# Altium schematic symbol library AA_Symbols.SchLib: 1017 symbols (part 1 of 7)
Pins are listed as number, name and electrical type; pins without a type are passive.

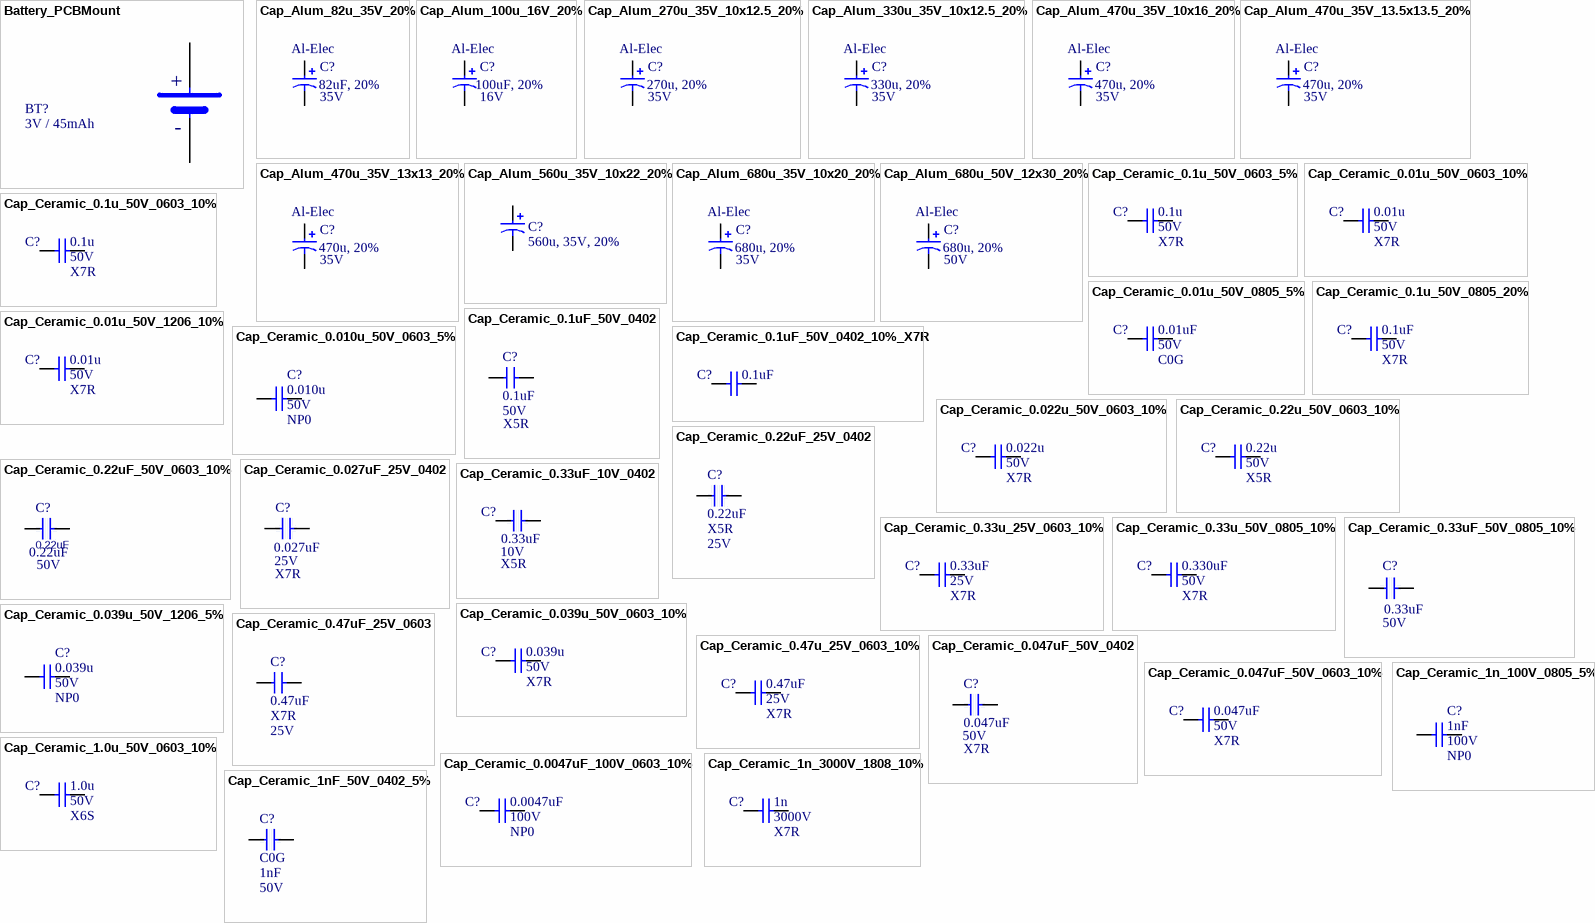
[diagram p0: symbols Battery_PCBMount to Cap_Ceramic_1nF_50V_0402_5%]

## Battery_PCBMount
designator BT?, comment 3V / 45mAh
Battery, PCB mount; Manufacturer: Panasonic - BSG; Manufacturer P/N: ML-2020/G1AN; Value: 3V / 45mAh; Outset P/N: *
footprint BATT_ML-2020/G1AN (BATT LITH 3V 45MAH COIN 20.0MM)
pins: 1 + (power), 2 - (power)

## Cap_Alum_82u_35V_20%
designator C?, comment DIELECTRIC: Al-Elec  Voltage: 35V  (hidden comment: 82uF, 20%)
Capacitor, Aluminum, 82UF 20% 35V SMD; Manufacturer: Panasonic; Manufacturer P/N: 35SVPF82M; Outset P/N: PN-0008192; Value: 82uF, 20%
pins: 1 POS, 2 NEG

## Cap_Alum_100u_16V_20%
designator C?, comment DIELECTRIC: Al-Elec  Voltage: 16V  (hidden comment: 100uF, 20%)
Capacitor, Aluminum, 100UF 20% 16V SMD; Manufacturer: Panasonic; Manufacturer P/N: 16SVPC100M; Outset P/N: PN-0008193; Value: 100uF, 20%
pins: 1 POS, 2 NEG

## Cap_Alum_270u_35V_10x12.5_20%
designator C?, comment DIELECTRIC: Al-Elec  Voltage: 35V  (hidden comment: 270u, 20%)
Capacitor, Aluminum, 270u, 35V, 10x12.5mm, 20%; Manufacturer: Panasonic; Manufacturer P/N: EEUFR1V271; Outset P/N: 0000001; Value: 270u, 20%
footprint CAP_POL_5-10X12.5MM (Capacitor, Polarized, Radial, 10x12.5mm, 5mm Lead Spacing)
pins: 1 POS, 2 NEG

## Cap_Alum_330u_35V_10x12.5_20%
designator C?, comment DIELECTRIC: Al-Elec  Voltage: 35V  (hidden comment: 330u, 20%)
Capacitor, Aluminum, 330u, 35V, 10x12.5mm, 20%; Manufacturer: Panasonic; Manufacturer P/N: EEUFR1V331U; Outset P/N: PN-0001786; Value: 330u, 20%
footprint CAP_POL_5-10X12.5MM (Capacitor, Polarized, Radial, 10x12.5mm, 5mm Lead Spacing)
pins: 1 POS, 2 NEG

## Cap_Alum_470u_35V_10x16_20%
designator C?, comment DIELECTRIC: Al-Elec  Voltage: 35V  (hidden comment: 470u, 20%)
Capacitor, Aluminum, 470u, 35V, 10x16mm, 20%; Manufacturer: Panasonic; Manufacturer P/N: EEUFR1V471; Outset P/N: 0000002; Value: 470u, 20%
footprint CAP_POL_5-10X16MM (Capacitor, Polarized, Radial, 10x16mm, 5mm Lead Spacing)
pins: 1 POS, 2 NEG

## Cap_Alum_470u_35V_13.5x13.5_20%
designator C?, comment DIELECTRIC: Al-Elec  Voltage: 35V  (hidden comment: 470u, 20%)
Capacitor, Aluminum, 470u, 35V, 13.5x13.5mm, 20%; Manufacturer: Panasonic; Manufacturer P/N: EEE-FK1V471AQ; Outset P/N: PN-0001781; Value: 470u, 20%
footprint CAP_POL_13.5X13.5MM_SMT (Footprint not found)
pins: 1 POS, 2 NEG

## Cap_Alum_470u_35V_13x13_20%
designator C?, comment DIELECTRIC: Al-Elec  Voltage: 35V  (hidden comment: 470u, 20%)
Capacitor, Aluminum, 470u, 35V, 13x13mm, 20%; Manufacturer: Chemi-Con; Manufacturer P/N: EMVH350ARA471MKG5S; Outset P/N: PN-0001754; Value: 470u, 20%
footprint CAP_POL_13X13MM_SMT (Footprint not found)
pins: 1 POS, 2 NEG

## Cap_Alum_560u_35V_10x22_20%
designator C?, comment 560u, 35V, 20%
Capacitor, Aluminum, 560u, 35V, 10x22mm, 20%; Manufacturer: Panasonic; Manufacturer P/N: EEU-FR1V561B; Outset P/N: PN-0002154; Distributor: Digi-Key; Distributor P/N: P15393CT-ND; Value: 560u, 35V, 20%; Supplier 1: Digi-Key; Supplier Part Number 1: P15393CT-ND
footprint CAP_POL_5-10X22MM (Capacitor, Polarized, Radial, 10x22mm, 5mm Lead Spacing)
pins: 1 POS, 2 NEG

## Cap_Alum_680u_35V_10x20_20%
designator C?, comment DIELECTRIC: Al-Elec  Voltage: 35V  (hidden comment: 680u, 20%)
Capacitor, Aluminum, 680u, 35V, 10x20mm, 20%; Manufacturer: Panasonic; Manufacturer P/N: EEU-FR1V681; Outset P/N: 0000003; Value: 680u, 20%
footprint CAP_POL_5-10X20MM (Capacitor, Polarized, Radial, 10x20mm, 5mm Lead Spacing)
pins: 1 POS, 2 NEG

## Cap_Alum_680u_50V_12x30_20%
designator C?, comment DIELECTRIC: Al-Elec  Voltage: 50V  (hidden comment: 680u, 20%)
Capacitor, Aluminum, 680u, 50V, 12x30mm, 20%; Manufacturer: Panasonic; Manufacturer P/N: EEU-FR1H681L; Outset P/N: 0000004; Value: 680u, 20%
footprint CAP_POL_5-12.5X30MM (Capacitor, Polarized, Radial, 12.5x30mm, 5mm Lead Spacing)
pins: 1 POS, 2 NEG

## Cap_Ceramic_0.1u_50V_0603_5%
designator C?, comment Voltage: 50V  DIELECTRIC: X7R  (hidden comment: 0.1u)
Capacitor, Ceramic, 0.1u, 50V, 0603, 5%; Manufacturer: Kemet; Manufacturer P/N: C0603C104J5RACTU; Outset P/N: 0000011; Value: 0.1u
footprint CC_1608_0603_N
pins: 1, 2

## Cap_Ceramic_0.01u_50V_0603_10%
designator C?, comment Voltage: 50V  DIELECTRIC: X7R  (hidden comment: 0.01u)
Capacitor, Ceramic, 0.01u, 50V, 0603, 10%; Manufacturer: Murata Electronics North America; Manufacturer P/N: GRM188R71H103KA01D; Outset P/N: 0000006; Value: 0.01u
footprint CC_1608_0603_N
pins: 1, 2

## Cap_Ceramic_0.1u_50V_0603_10%
designator C?, comment Voltage: 50V  DIELECTRIC: X7R  (hidden comment: 0.1u)
Capacitor, Ceramic, 0.1u, 50V, 0603, 10%; Manufacturer: Murata Electronics North America; Manufacturer P/N: GRM188R71H104KA93D; Outset P/N: 0000010; Value: 0.1u
footprint CC_1608_0603_N
pins: 1, 2

## Cap_Ceramic_0.01u_50V_0805_5%
designator C?, comment Voltage: 50V  DIELECTRIC: C0G  (hidden comment: 0.01uF)
Capacitor, Ceramic 10000 pF ±5% 50V  C0G, NP0 0805 (2012 Metric); Manufacturer: TDK Corporation; Manufacturer P/N: CGA4C2C0G1H103J060AA; Outset P/N: PN-0008189; Value: 0.01uF
footprint CC_2012_0805_N
pins: 1, 2

## Cap_Ceramic_0.1u_50V_0805_20%
designator C?, comment Voltage: 50V  DIELECTRIC: X7R  (hidden comment: 0.1uF)
Capacitor, Ceramic 0.1 µF ±20% 50V 0805; Manufacturer: KEMET; Manufacturer P/N: C0805C104M5RAC7800; Outset P/N: PN-0008190; Value: 0.1uF
footprint CC_2012_0805_N
pins: 1, 2

## Cap_Ceramic_0.01u_50V_1206_10%
designator C?, comment DIELECTRIC: X7R  Voltage: 50V  (hidden comment: 0.01u)
Capacitor, Ceramic, X7R, 0.01u, 50V, 1206, 10%; Manufacturer: Kemet; Manufacturer P/N: C1206S103K5RACTU; Outset P/N: PN-0004383; Value: 0.01u
footprint CC_3216_1206_N (Footprint not found)
pins: 1, 2

## Cap_Ceramic_0.1uF_50V_0402
designator C?, comment DIELECTRIC: X5R  VOLTAGE: 50V  (hidden comment: 0.1uF)
Capacitor, Ceramic, 0.1uF, 50V, 0402, 5%, X5R; Manufacturer P/N: GRM155R61H104JE14D; Manufacturer: Murata Electronics; Outset P/N: PN-0007217; Tolerance: 5%; OPERATING TEMPERATURE: -55C ~ 85C; VALUE: 0.1uF
footprint CC_1005_0402_L
pins: 1, 2

## Cap_Ceramic_0.1uF_50V_0402_10%_X7R
designator C?, comment 0.1uF
Capacitor, Ceramic, 0.1uF, 50V, 0402, 10%, X7R; Manufacturer: Murata; Manufacturer P/N: GCM155R71H104KE02D; Outset P/N: PN-0001451; Value: 0.1uF
footprint CC_1005_0402_N (Chip Capacitor, 2-Leads, Body 1.0x0.5mm, IPC Medium Density)
footprint 0402 (Paramit's recommendation)
pins: 1, 2

## Cap_Ceramic_0.010u_50V_0603_5%
designator C?, comment DIELECTRIC: NP0  Voltage: 50V  (hidden comment: 0.010u)
Capacitor, Ceramic, NP0, 0.010u, 50V, 0603, 5%; Manufacturer: Murata; Manufacturer P/N: GRM1885C1H103JA01D; Outset P/N: PN-0001676; Value: 0.010u
footprint CC_1608_0603_N (Chip Capacitor, 2-Leads, Body 1.6x0.8mm, IPC Medium Density)
pins: 1, 2

## Cap_Ceramic_0.022u_50V_0603_10%
designator C?, comment Voltage: 50V  DIELECTRIC: X7R  (hidden comment: 0.022u)
Capacitor, Ceramic, 0.022u, 50V, 0603, 10%; Manufacturer: TDK Corporation; Manufacturer P/N: C1608X7R1H223K; Outset P/N: 0000007; Value: 0.022u
footprint CC_1608_0603_N
pins: 1, 2

## Cap_Ceramic_0.22u_50V_0603_10%
designator C?, comment Voltage: 50V  DIELECTRIC: X5R  (hidden comment: 0.22u)
Capacitor, Ceramic, 0.22u, 50V, 0603, 10%; Manufacturer: TDK Corporation; Manufacturer P/N: C1608X5R1H224K; Outset P/N: 0000012; Value: 0.22u
footprint CC_1608_0603_N
pins: 1, 2

## Cap_Ceramic_0.22uF_25V_0402
designator C?, comment DIELECTRIC: X5R  VOLTAGE: 25V  (hidden comment: 0.22uF)
Capacitor, Ceramic, 0.22uF, 25V, 0402, 10%, X5R; Manufacturer P/N: CC0402KRX5R8BB224; Manufacturer: Yageo; Outset P/N: PN-0007208; TOLERANCE: 10%; TEMPERATURE: -55C ~ 85C; VALUE: 0.22uF
footprint CC_1005_0402_L
pins: 1, 2

## Cap_Ceramic_0.22uF_50V_0603_10%
designator C?, comment 0.22uF  VOLTAGE: 50V
Capacitor, Ceramic, 0.22uF, 50V, 0603, 10%, X7R; Manufacturer P/N: CC0603KRX7R9BB224; Manufacturer: Yageo; Outset P/N: PN-0007049; TOLERANCE: 10%; TEMPERATURE: -55C ~ 125C; DIELECTRIC: X7R; VALUE: 0.22uF
footprint CC_1608_0603_N
footprint CC_1608_0603_L
pins: 1, 2

## Cap_Ceramic_0.027uF_25V_0402
designator C?, comment DIELECTRIC: X7R  VOLTAGE: 25V  (hidden comment: 0.027uF)
Capacitor, Ceramic, 0.027uF, 25V, 0402, 10%, X7R; Manufacturer P/N: CC0402KRX7R8BB273; Manufacturer: Yageo; Outset P/N: PN-0007212; TOLERANCE: 10%; TEMPERATURE: -55C ~ 125C; VALUE: 0.027uF
footprint CC_1005_0402_L
pins: 1, 2

## Cap_Ceramic_0.33u_25V_0603_10%
designator C?, comment Voltage: 25V  DIELECTRIC: X7R  (hidden comment: 0.33uF)
Capacitor, Ceramic, 0.33u, 25V, 0603; Manufacturer: TDK Corporation; Manufacturer P/N: C1608X7R1E334K080AC; Outset P/N: PN-0006244; Value: 0.33uF
footprint CC_1608_0603_N
pins: 1, 2

## Cap_Ceramic_0.33u_50V_0805_10%
designator C?, comment Voltage: 50V  DIELECTRIC: X7R  (hidden comment: 0.330uF)
Capacitor, Ceramic, 0.33u, 50V, 0805, 10%; Manufacturer: Kemet; Manufacturer P/N: C0805C334K5RACAUTO; Outset P/N: 0000013; Value: 0.330uF
footprint CC_2012_0805_N
pins: 1, 2

## Cap_Ceramic_0.33uF_10V_0402
designator C?, comment DIELECTRIC: X5R  VOLTAGE: 10V  (hidden comment: 0.33uF)
Capacitor, Ceramic, 0.33uF, 10V, 0402, 10%, X5R; Manufacturer P/N: CC0402KRX5R6BB334; Manufacturer: Yageo; Outset P/N: PN-0007209; TOLERANCE: 10%; TEMPERATURE: -55C ~ 85C; VALUE: 0.33uF
footprint CC_1005_0402_L
pins: 1, 2

## Cap_Ceramic_0.33uF_50V_0805_10%
designator C?, comment VOLTAGE: 50V  (hidden comment: 0.33uF)
Capacitor, Ceramic, 0.33uF, 50V, 0805, 10%, X7R; Manufacturer P/N: CC0805KKX7R9BB334; Manufacturer: Yageo; Outset P/N: PN-0007050; TOLERANCE: 10%; TEMPERATURE: -55°C ~ 125°C; DIELECTRIC: X7R; VALUE: 0.33uF
footprint CC_2012_0805_N
footprint CC_2012_0805_L
pins: 1, 2

## Cap_Ceramic_0.039u_50V_0603_10%
designator C?, comment Voltage: 50V  DIELECTRIC: X7R  (hidden comment: 0.039u)
Capacitor, Ceramic, 0.039u, 50V, 0603, 10%; Manufacturer: AVX Corporation; Manufacturer P/N: 06035C393KAT2A; Outset P/N: 0000008; Value: 0.039u
footprint CC_1608_0603_N
pins: 1, 2

## Cap_Ceramic_0.039u_50V_1206_5%
designator C?, comment DIELECTRIC: NP0  Voltage: 50V  (hidden comment: 0.039u)
Capacitor, Ceramic, NP0, 0.039u, 50V, 1206, 5%; Manufacturer: Murata; Manufacturer P/N: GRM3195C1H393JA01D; Outset P/N: PN-0001675; Value: 0.039u
footprint CC_3216_1206_N (Chip Capacitor, 2-Leads, Body 3.2x1.6mm, IPC Medium Density)
pins: 1, 2

## Cap_Ceramic_0.47u_25V_0603_10%
designator C?, comment Voltage: 25V  DIELECTRIC: X7R  (hidden comment: 0.47uF)
Capacitor, Ceramic, 0.47u, 25V, 0603; Manufacturer: Yageo; Manufacturer P/N: CC0603KRX7R8BB474; Outset P/N: PN-0006245; Value: 0.47uF
footprint CC_1608_0603_N
pins: 1, 2

## Cap_Ceramic_0.47uF_25V_0603
designator C?, comment DIELECTRIC: X7R  VOLTAGE: 25V  (hidden comment: 0.47uF)
Capacitor, Ceramic, 0.47uF, 25V, 0603, 10%, X7R; Manufacturer P/N: GRM188R71E474KA12D; Manufacturer: Murata Electronics; Outset P/N: PN-0007219; Tolerance: 10%; OPERATING TEMPERATURE: -55C ~ 125C; VALUE: 0.47uF
footprint CC_1608_0603_N
footprint CC_1608_0603_L
pins: 1, 2

## Cap_Ceramic_0.047uF_50V_0402
designator C?, comment DIELECTRIC: X7R  VOLTAGE: 50V  (hidden comment: 0.047uF)
Capacitor, Ceramic, 0.047uF, 50V, 0402, 10%, X7R; Manufacturer P/N: CC0402KRX7R9BB473; Manufacturer: Yageo; Outset P/N: PN-0007210; TOLERANCE: 10%; TEMPERATURE: -55C ~ 125C; VALUE: 0.047uF
footprint CC_1005_0402_L
pins: 1, 2

## Cap_Ceramic_0.047uF_50V_0603_10%
designator C?, comment DIELECTRIC: X7R  Voltage: 50V  (hidden comment: 0.047uF)
Capacitor, Ceramic, 0.047uF, 50V, 0603, 10%; Manufacturer: Kemet; Manufacturer P/N: C0603C473K5RACAUTO; Outset P/N: 0000009; Value: 0.047uF
footprint CC_1608_0603_N
pins: 1, 2

## Cap_Ceramic_0.0047uF_100V_0603_10%
designator C?, comment Voltage: 100V  DIELECTRIC: NP0  (hidden comment: 0.0047uF)
Capacitor, Ceramic, 0.0047uF, 100V, 0603, 10%; Manufacturer: Kemet; Manufacturer P/N: C0603C472J1GACTU; Outset P/N: 0000005; Value: 0.0047uF
footprint CC_1608_0603_N
pins: 1, 2

## Cap_Ceramic_1.0u_50V_0603_10%
designator C?, comment Voltage: 50V  DIELECTRIC: X6S  (hidden comment: 1.0u)
Capacitor, Ceramic, 1.0u, 50V, 0603, 10%; Manufacturer: TDK Corporation; Manufacturer P/N: C1608X6S1H105K; Outset P/N: 0000014; Value: 1.0u
footprint CC_1608_0603_N
pins: 1, 2

## Cap_Ceramic_1n_100V_0805_5%
designator C?, comment DIELECTRIC: NP0  Voltage: 100V  (hidden comment: 1nF)
Capacitor, Ceramic, 1nF, 100V, 0805 5%; Manufacturer: TDK; Manufacturer P/N: CGA4C2C0G2A102J060AA; Outset P/N: PN-0002793; Value: 1nF
footprint CC_2012_0805_N (Chip Capacitor, 2-Leads, Body 2.0x1.3mm, IPC Medium Density)
pins: 1, 2

## Cap_Ceramic_1n_3000V_1808_10%
designator C?, comment DIELECTRIC: X7R  Voltage: 3000V  (hidden comment: 1n)
Capacitor, Ceramic, X7R, 1nF, 3kV, 1808, 10%; Manufacturer: Johanson Dielectrics; Manufacturer P/N: 302R29W102KV4E; Outset P/N: PN-0001755; Value: 1n
footprint CC_4520_1808_N (Chip Capacitor, 2-Leads, Body 4.5x2.0mm, IPC Medium Density)
pins: 1, 2

## Cap_Ceramic_1nF_50V_0402_5%
designator C?, comment DIELECTRIC: C0G  VOLTAGE: 50V  (hidden comment: 1nF)
Capacitor, Ceramic, 1nF, 50V, 0402, 5%, C0G; Manufacturer P/N: CC0402JRNPO9BN102; Manufacturer: Yageo; Outset P/N: PN-0007036; TOLERANCE: 5%; TEMPERATURE: -55C ~ 125C; VALUE: 1nF
footprint CC_1005_0402_L
pins: 1, 2

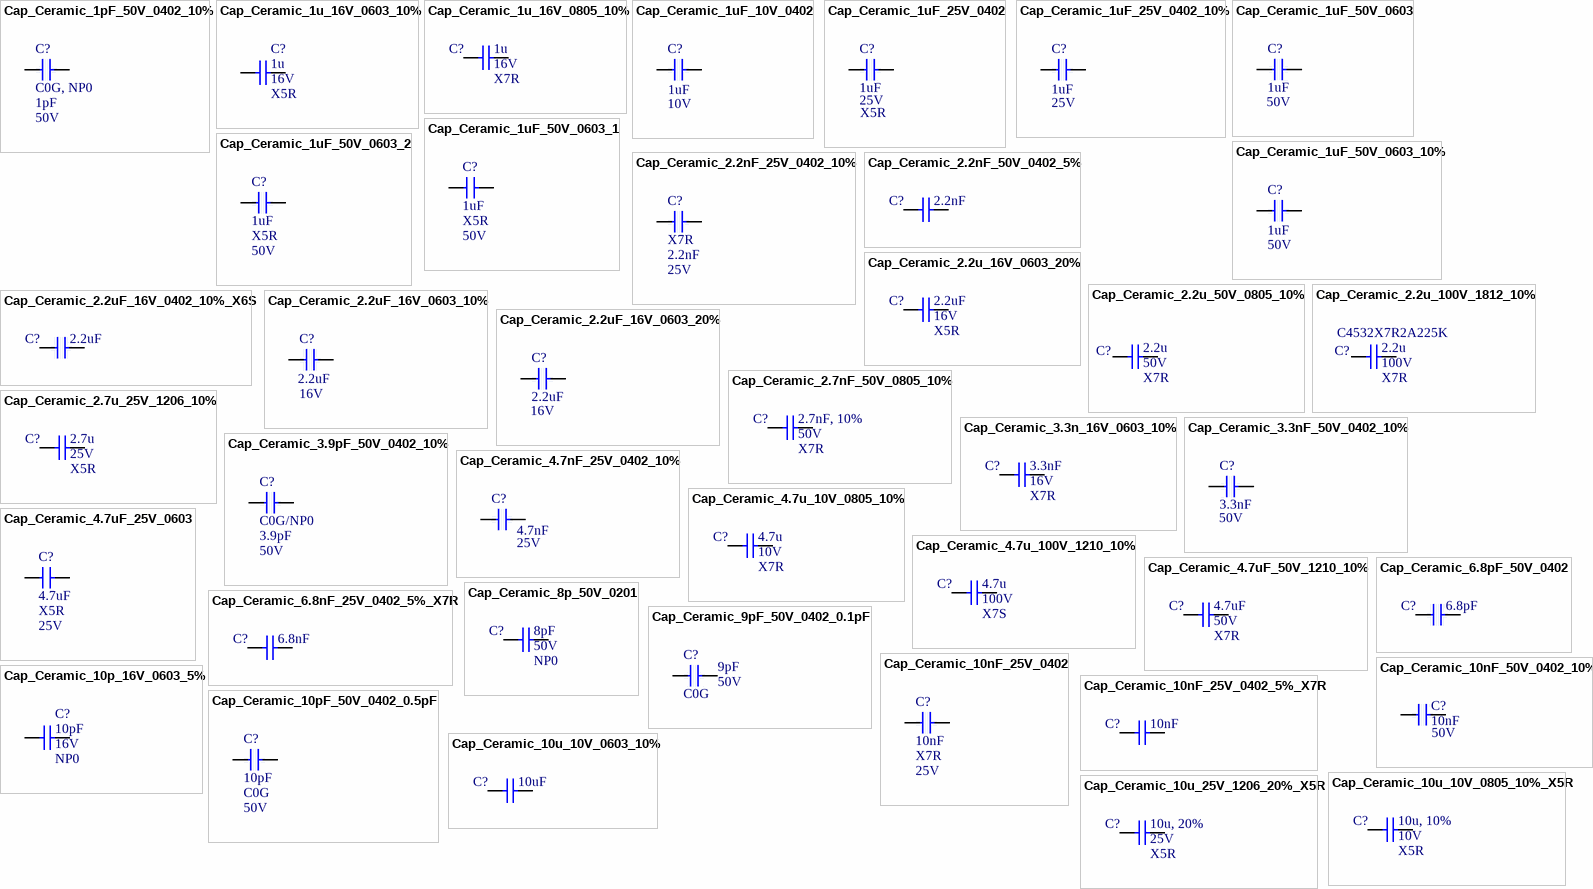
[diagram p1: symbols Cap_Ceramic_1pF_50V_0402_10% to Cap_Ceramic_10u_25V_1206_20%_X5R]

## Cap_Ceramic_1pF_50V_0402_10%
designator C?, comment DIELECTRIC: C0G, NP0  VOLTAGE: 50V  (hidden comment: 1pF)
Capacitor, Ceramic, 1pF, 50V, 0402, 10%, C0G/NP0; Manufacturer P/N: C0402C109B5GAC7867; Manufacturer: Kemet; Outset P/N: PN-0008326; TOLERANCE: 0.1pF; TEMPERATURE: -55C ~ 125C; VALUE: 1pF
footprint CC_1005_0402_L
pins: 1, 2

## Cap_Ceramic_1u_16V_0603_10%
designator C?, comment DIELECTRIC: X5R  Voltage: 16V  (hidden comment: 1u)
Capacitor, Ceramic, X5R, 1u, 16V, 0603, 10%; Manufacturer: AVX; Manufacturer P/N: 0603YD105KAT2A; Outset P/N: PN-0001758; Value: 1u
footprint CC_1608_0603_N (Chip Capacitor, 2-Leads, Body 1.6x0.8mm, IPC Medium Density)
pins: 1, 2

## Cap_Ceramic_1u_16V_0805_10%
designator C?, comment DIELECTRIC: X7R  Voltage: 16V  (hidden comment: 1u)
Capacitor, Ceramic, X7R, 1u, 16V, 0805, 10%; Manufacturer: AVX; Manufacturer P/N: 0805YC105KAT2A; Outset P/N: PN-0002783; Value: 1u
footprint CC_2012_0805_N (Chip Capacitor, 2-Leads, Body 2.0x1.3mm, IPC Medium Density)
pins: 1, 2

## Cap_Ceramic_1uF_10V_0402
designator C?, comment VOLTAGE: 10V  (hidden comment: 1uF)
Capacitor, Ceramic, 1uF, 10V, 0402, 20%, X5R; Manufacturer: KEMET; Manufacturer P/N: C0402C105M8PACTU; Outset P/N: PN-0007124; TOLERANCE: 20%; TEMPERATURE: -55C ~ 85C; DIELECTRIC: X5R; VALUE: 1uF
footprint CC_1005_0402_L
pins: 1, 2

## Cap_Ceramic_1uF_25V_0402
designator C?, comment DIELECTRIC: X5R  VOLTAGE: 25V  (hidden comment: 1uF)
Capacitor, Ceramic, 1uF, 25V, 0402, 10%, X5R; Manufacturer P/N: CL05A105KA5NQNC; Manufacturer: Samsung Electro-Mechanics; Outset P/N: PN-0007213; TOLERANCE: 10%; TEMPERATURE: -55C ~ 85C; VALUE: 1uF
footprint CC_1005_0402_L
pins: 1, 2

## Cap_Ceramic_1uF_25V_0402_10%
designator C?, comment VOLTAGE: 25V  (hidden comment: 1uF)
Capacitor, Ceramic, 1uF, 25V, 0402, 10%, X5R; Manufacturer P/N: CL05A105KA5NQNC; Manufacturer: Samsung Electro-Mechanics; Outset P/N: PN-0007045; TOLERANCE: 10%; TEMPERATURE: -55C ~ 85C; DIELECTRIC: X5R; VALUE: 1uF
footprint CC_1005_0402_L
pins: 1, 2

## Cap_Ceramic_1uF_50V_0603
designator C?, comment VOLTAGE: 50V  (hidden comment: 1uF)
Capacitor, Ceramic, 1uF, 50V, 0603, 10%, X5R; Manufacturer: Yageo; Manufacturer P/N: CC0603KRX5R9BB105; Outset P/N: PN-0007126; TOLERANCE: 10%; TEMPERATURE: -55C ~ 85C; DIELECTRIC: X5R; VALUE: 1uF
footprint CC_1608_0603_N (Chip Capacitor, 2-Leads, Body 1.6x0.8mm, IPC Medium Density)
footprint CC_1608_0603_L (Chip Capacitor, 2-Leads, Body 1.6x0.8mm, IPC Least Density)
pins: 1, 2

## Cap_Ceramic_1uF_50V_0603_1
designator C?, comment DIELECTRIC: X5R  VOLTAGE: 50V  (hidden comment: 1uF)
Capacitor, Ceramic, 1uF, 50V, 0603, 10%, X5R; Manufacturer P/N: CL10A105KB8NNNC; Manufacturer: Samsung Electro-Mechanics; Outset P/N: PN-0007216; Tolerance: 10%; VALUE: 1uF
footprint CC_1608_0603_N
footprint CC_1608_0603_L
pins: 1, 2

## Cap_Ceramic_1uF_50V_0603_2
designator C?, comment DIELECTRIC: X5R  VOLTAGE: 50V  (hidden comment: 1uF)
Capacitor, Ceramic, 1uF, 50V, 0603, 10%, X5R; Manufacturer P/N: CC0603KRX5R9BB105; Manufacturer: Yageo; Outset P/N: PN-0007214; TOLERANCE: 10%; TEMPERATURE: -55C ~ 85C; VALUE: 1uF
footprint CC_1608_0603_N
footprint CC_1608_0603_L
pins: 1, 2

## Cap_Ceramic_1uF_50V_0603_10%
designator C?, comment VOLTAGE: 50V  (hidden comment: 1uF)
Capacitor, Ceramic, 1uF, 50V, 0603, 10%, X5R; Manufacturer P/N: CC0603KRX5R9BB105; Manufacturer: Yageo; Outset P/N: PN-0007046; TOLERANCE: 10%; TEMPERATURE: -55C ~ 85C; DIELECTRIC: X5R; VALUE: 1uF
footprint CC_1608_0603_N
footprint CC_1608_0603_L
pins: 1, 2

## Cap_Ceramic_2.2nF_25V_0402_10%
designator C?, comment DIELECTRIC: X7R  VOLTAGE: 25V  (hidden comment: 2.2nF)
Capacitor, Ceramic, 2.2nF, 25V, 0402, 10%, X7R; Manufacturer P/N: C0402C222K3RAC7867; Manufacturer: Kemet; Outset P/N: PN-0008329; TOLERANCE: 10%; TEMPERATURE: -55C ~ 125C; VALUE: 2.2nF
footprint CC_1005_0402_L
pins: 1, 2

## Cap_Ceramic_2.2nF_50V_0402_5%
designator C?, comment 2.2nF
Cap_Ceramic_2.2nF_50V_0402, 5%, X7R; Manufacturer: Kemet; Manufacturer P/N: C0402C222J5RACTU; Outset P/N: PN-0005389; Value: 2.2nF
footprint CC_1005_0402_N (Chip Capacitor, 2-Leads, Body 1.0x0.5mm, IPC Medium Density)
footprint CC_1005_0402_N (Chip Capacitor, 2-Leads, Body 1.0x0.5mm, IPC Medium Density)
pins: 1, 2

## Cap_Ceramic_2.2u_16V_0603_20%
designator C?, comment Voltage: 16V  DIELECTRIC: X5R  (hidden comment: 2.2uF)
Capacitor, Ceramic, 2.2u, 16V, 0603, 20%; Manufacturer: TDK; Manufacturer P/N: CGA3E1X5R1C225M080AC; Outset P/N: PN-0006590; Value: 2.2uF
footprint CC_1608_0603_N (Chip Capacitor, 2-Leads, Body 1.6x0.8mm, IPC Medium Density)
pins: 1, 2

## Cap_Ceramic_2.2u_50V_0805_10%
designator C?, comment Voltage: 50V  DIELECTRIC: X7R  (hidden comment: 2.2u)
Capacitor, Ceramic, 2.2u, 50V, 0805 10%; Manufacturer: TDK Corporation; Manufacturer P/N: C2012X7R1H225K; Outset P/N: 0000024; Value: 2.2u
footprint CC_2012_0805_N
pins: 1, 2

## Cap_Ceramic_2.2u_100V_1812_10%
designator C?, comment Voltage: 100V  DIELECTRIC: X7R  Supplier Part Number 1: C4532X7R2A225K  (hidden comment: 2.2u)
Capacitor, Ceramic, 2.2u, 100V, 1812, X7R, 10%; Manufacturer: TDK Corporation; Manufacturer P/N: C4532X7R2A225K230KA; Outset P/N: PN-0003763; Supplier 1: Avnet; Value: 2.2u
footprint CC_4532_1812_N (Chip Capacitor, 2-Leads, Body 4.5x3.2mm, IPC Medium Density)
pins: 1, 2

## Cap_Ceramic_2.2uF_16V_0402_10%_X6S
designator C?, comment 2.2uF
Capacitor, Ceramic, 2.2uF, 16V, 0402, 10%, X6S; Manufacturer: Murata; Manufacturer P/N: GRT155C81C225KE13D; Outset P/N: PN-0001466; Value: 2.2uF
footprint CC_1005_0402_L
pins: 1, 2

## Cap_Ceramic_2.2uF_16V_0603_10%
designator C?, comment VOLTAGE: 16V  (hidden comment: 2.2uF)
Capacitor, Ceramic, 2.2uF, 16V, 0603, 10%, X5R; Manufacturer P/N: CC0603KRX5R7BB225; Manufacturer: Yageo; Outset P/N: PN-0007047; TOLERANCE: 10%; TEMPERATURE: -55C ~ 85C; DIELECTRIC: X5R; VALUE: 2.2uF
footprint CC_1608_0603_N
footprint CC_1608_0603_L (Footprint not found)
pins: 1, 2

## Cap_Ceramic_2.2uF_16V_0603_20%
designator C?, comment VOLTAGE: 16V  (hidden comment: 2.2uF)
Capacitor, Ceramic, 2.2uF, 16V, 0603, 20%, X5R; Manufacturer P/N: CC0603MRX5R7BB225; Manufacturer: Yageo; Outset P/N: PN-0007048; TOLERANCE: 20%; TEMPERATURE: -55C ~ 85C; DIELECTRIC: X5R; VALUE: 2.2uF
footprint CC_1608_0603_N
footprint CC_1608_0603_L (Footprint not found)
pins: 1, 2

## Cap_Ceramic_2.7nF_50V_0805_10%
designator C?, comment Voltage: 50V  DIELECTRIC: X7R  (hidden comment: 2.7nF, 10%)
Capacitor, Ceramic, 2.7nF, 50V, 0805, 10%; Manufacturer: TDK Corporation; Manufacturer P/N: CC0805KRX7R9BB272; Outset P/N: PN-0003752; Value: 2.7nF, 10%
footprint CC_2012_0805_N (Chip Capacitor, 2-Leads, Body 2.0x1.3mm, IPC Medium Density)
pins: 1, 2

## Cap_Ceramic_2.7u_25V_1206_10%
designator C?, comment DIELECTRIC: X5R  Voltage: 25V  (hidden comment: 2.7u)
Capacitor, Ceramic, X5R, 2.7u, 25V, 1206, 10%; Manufacturer: Kemet; Manufacturer P/N: C1206C275K3PACTU; Outset P/N: PN-0001721; Value: 2.7u
footprint CC_3216_1206_N (Footprint not found)
pins: 1, 2

## Cap_Ceramic_3.3n_16V_0603_10%
designator C?, comment DIELECTRIC: X7R  Voltage: 16V  (hidden comment: 3.3nF)
Capacitor, Ceramic, X7R, 3.3nf, 16V, 0603, 10%; Manufacturer: Kemet; Manufacturer P/N: C0603C332K4RACTU; Outset P/N: PN-0001771; Value: 3.3nF
footprint CC_1608_0603_N (Chip Capacitor, 2-Leads, Body 1.6x0.8mm, IPC Medium Density)
pins: 1, 2

## Cap_Ceramic_3.3nF_50V_0402_10%
designator C?, comment VOLTAGE: 50V  (hidden comment: 3.3nF)
Capacitor, Ceramic, 3.3nF, 50V, 0402, 10%, X7R; Manufacturer P/N: CC0402KRX7R9BB332; Manufacturer: Yageo; Outset P/N: PN-0007042; TOLERANCE: 10%; TEMPERATURE: -55C ~ 125C; DIELECTRIC: X7R; VALUE: 3.3nF
footprint CC_1005_0402_L
pins: 1, 2

## Cap_Ceramic_3.9pF_50V_0402_10%
designator C?, comment DIELECTRIC: C0G/NP0  VOLTAGE: 50V  (hidden comment: 3.9pF)
Capacitor, Ceramic, 3.9pF, 50V, 0402, 10%, C0G/NP0; Manufacturer P/N: C0402C399C5GAC7867; Manufacturer: Kemet; Outset P/N: PN-0008327; TOLERANCE: 0.25pF; TEMPERATURE: -55C ~ 125C; VALUE: 3.9pF
footprint CC_1005_0402_L
pins: 1, 2

## Cap_Ceramic_4.7nF_25V_0402_10%
designator C?, comment VOLTAGE: 25V  (hidden comment: 4.7nF)
Capacitor, Ceramic, 4.7nF, 25V, 0402, 10%, X7R; Manufacturer P/N: CC0402KRX7R8BB472; Manufacturer: Yageo; Outset P/N: PN-0007163; TOLERANCE: 10%; TEMPERATURE: -55C ~ 125C; DIELECTRIC: X7R; VALUE: 4.7nF
footprint CC_1005_0402_L
pins: 1, 2

## Cap_Ceramic_4.7u_10V_0805_10%
designator C?, comment DIELECTRIC: X7R  Voltage: 10V  (hidden comment: 4.7u)
Capacitor, Ceramic, X7R, 4.7u, 10V, 0805, 10%; Manufacturer: Samsung; Manufacturer P/N: CL21B475KPFNNNE; Outset P/N: PN-0003749; Value: 4.7u
footprint CC_2012_0805_N (Chip Capacitor, 2-Leads, Body 2.0x1.3mm, IPC Medium Density)
pins: 1, 2

## Cap_Ceramic_4.7u_100V_1210_10%
designator C?, comment DIELECTRIC: X7S  Voltage: 100V  (hidden comment: 4.7u)
Capacitor, Ceramic, X7S, 4.7 uF, 100V, 1210, 10%; Manufacturer: TDK Corporation; Manufacturer P/N: CGA6M3X7S2A475K200AB; Outset P/N: PN-0001705; Value: 4.7u
footprint CC_3225_1210_N (Chip Capacitor, 2-Leads, Body 3.2x2.5mm, IPC Medium Density)
pins: 1, 2

## Cap_Ceramic_4.7uF_25V_0603
designator C?, comment DIELECTRIC: X5R  VOLTAGE: 25V  (hidden comment: 4.7uF)
Capacitor, Ceramic, 4.7uF, 25V, 0603, 10%, X5R; Manufacturer P/N: GRM188R61E475KE11D; Manufacturer: Murata Electronics; Outset P/N: PN-0007218; Tolerance: 10%; OPERATING TEMPERATURE: -55C ~ 85C; VALUE: 4.7uF
footprint CC_1608_0603_N
footprint CC_1608_0603_L
pins: 1, 2

## Cap_Ceramic_4.7uF_50V_1210_10%
designator C?, comment Voltage: 50V  DIELECTRIC: X7R  (hidden comment: 4.7uF)
Capacitor, Ceramic, 4.7uF, 50V, 1210, 10%; Manufacturer: Murata Electronics North America; Manufacturer P/N: GRM32ER71H475KA88L; Outset P/N: 0000028; Value: 4.7uF
footprint CC_3225_1210_N
pins: 1, 2

## Cap_Ceramic_6.8nF_25V_0402_5%_X7R
designator C?, comment 6.8nF
Cap_Ceramic_6.8nF_25V_0402_5%_X7R; Manufacturer: Kemet; Manufacturer P/N: C0402C682J3RACTU; Outset P/N: PN-0005390; Value: 6.8nF
footprint CC_1005_0402_N (Chip Capacitor, 2-Leads, Body 1.0x0.5mm, IPC Medium Density)
footprint 0402 (Paramit's recommendation)
pins: 1, 2

## Cap_Ceramic_6.8pF_50V_0402
designator C?, comment 6.8pF
Capacitor, Ceramic, 6.8pF, +/-0.5pF, 50V C0G/NPO 0402; Manufacturer: Yageo; Manufacturer P/N: CC0402DRNPO9BN6R8; Outset P/N: PN-0005557; Value: 6.8pF
footprint CC_1005_0402_L
pins: 1, 2

## Cap_Ceramic_8p_50V_0201
designator C?, comment Voltage: 50V  DIELECTRIC: NP0  (hidden comment: 8pF)
Capacitor, Ceramic, 8pF, 50V, 0201, +-0.25pF; Manufacturer: Murata Electronics North America; Manufacturer P/N: GRM0335C1E8R0CA01D; Outset P/N: PN-0008191; Value: 8pF
footprint CC_0201
pins: 1, 2

## Cap_Ceramic_9pF_50V_0402_0.1pF
designator C?, comment DIELECTRIC: C0G  VOLTAGE: 50V  (hidden comment: 9pF)
Capacitor, Ceramic, 9pF, 50V, 0402, +/-0.1pF, C0G; Manufacturer P/N: CC0402BRNPO9BN9R0; Manufacturer: Yageo; Outset P/N: PN-0007031; TOLERANCE: 0.1pF; TEMPERATURE: -55C ~ 125C; VALUE: 9pF
footprint CC_1005_0402_L
pins: 1, 2

## Cap_Ceramic_10nF_25V_0402
designator C?, comment DIELECTRIC: X7R  VOLTAGE: 25V  (hidden comment: 10nF)
Capacitor, Ceramic, 10nF, 25V, 0402, 10%, X7R; Manufacturer P/N: CC0402KRX7R8BB103; Manufacturer: Yageo; Outset P/N: PN-0007211; TOLERANCE: 10%; TEMPERATURE: -55C ~ 125C; VALUE: 10nF
footprint CC_1005_0402_L
pins: 1, 2

## Cap_Ceramic_10nF_25V_0402_5%_X7R
designator C?, comment 10nF
Cap_Ceramic_10nF_25V_0402_5%_X7R; Manufacturer: Kemet; Manufacturer P/N: C0402C103J3RACTU; Outset P/N: PN-0005393; Value: 10nF
footprint CC_1005_0402_N (Chip Capacitor, 2-Leads, Body 1.0x0.5mm, IPC Medium Density)
footprint 0402 (Paramit's recommendation)
pins: 1, 2

## Cap_Ceramic_10nF_50V_0402_10%
designator C?, comment VOLTAGE: 50V  (hidden comment: 10nF)
Capacitor, Ceramic, 10nF, 50V, 0402, 10%, X7R; Manufacturer P/N: CC0402KRX7R9BB103; Manufacturer: Yageo; Outset P/N: PN-0007040; DIELECTRIC: X7R; TOLERANCE: 10%; TEMPERATURE: -55C ~ 125C; VALUE: 10nF
footprint CC_1005_0402_L
pins: 1, 2

## Cap_Ceramic_10p_16V_0603_5%
designator C?, comment DIELECTRIC: NP0  Voltage: 16V  (hidden comment: 10pF)
Capacitor, Ceramic, NP0, 10pF, 16V, 0603, 5%; Manufacturer: Wurth Electronics; Manufacturer P/N: 885012006017; Outset P/N: PN-0001772; Value: 10pF
footprint CC_1608_0603_N (Chip Capacitor, 2-Leads, Body 1.6x0.8mm, IPC Medium Density)
pins: 1, 2

## Cap_Ceramic_10pF_50V_0402_0.5pF
designator C?, comment DIELECTRIC: C0G  VOLTAGE: 50V  (hidden comment: 10pF)
Capacitor, Ceramic, 10pF, 50V, 0402, +/-0.5pF, C0G; Manufacturer P/N: CC0402DRNPO9BN100; Manufacturer: Yageo; TOLERANCE: 0.5pF; Outset P/N: PN-0007032; TEMPERATURE: -55C ~ 125C; VALUE: 10pF
footprint CC_1005_0402_L
pins: 1, 2

## Cap_Ceramic_10u_10V_0603_10%
designator C?, comment 10uF
Capacitor, Ceramic, 10u, 10V, 0603, 10%; Manufacturer: Samsung; Manufacturer P/N: CL10A106KP8NNNC; Outset P/N: PN-0008332; DIELECTRIC: X5R; Voltage: 10V; TEMPERATURE: -55 ~ 125C; Value: 10uF
footprint CC_1608_0603_N
pins: 1, 2

## Cap_Ceramic_10u_10V_0805_10%_X5R
designator C?, comment Voltage: 10V  DIELECTRIC: X5R  (hidden comment: 10u, 10%)
Capacitor, Ceramic, 10u, 10V, 0805, 10%; Manufacturer: Kemet; Manufacturer P/N: C0805C106K8PACTU; Outset P/N: 0000018; Value: 10u, 10%
footprint CC_2012_0805_N
pins: 1, 2

## Cap_Ceramic_10u_25V_1206_20%_X5R
designator C?, comment Voltage: 25V  DIELECTRIC: X5R  (hidden comment: 10u, 20%)
Capacitor, Ceramic, 10u, 25V, 1206, 20%, X5R; Manufacturer: Kemet; Manufacturer P/N: C1206C106M3PACTU; Outset P/N: 0000019; Value: 10u, 20%
footprint CC_3216_1206_N (Chip Capacitor, 2-Leads, Body 3.2x1.6mm, IPC Medium Density)
pins: 1, 2

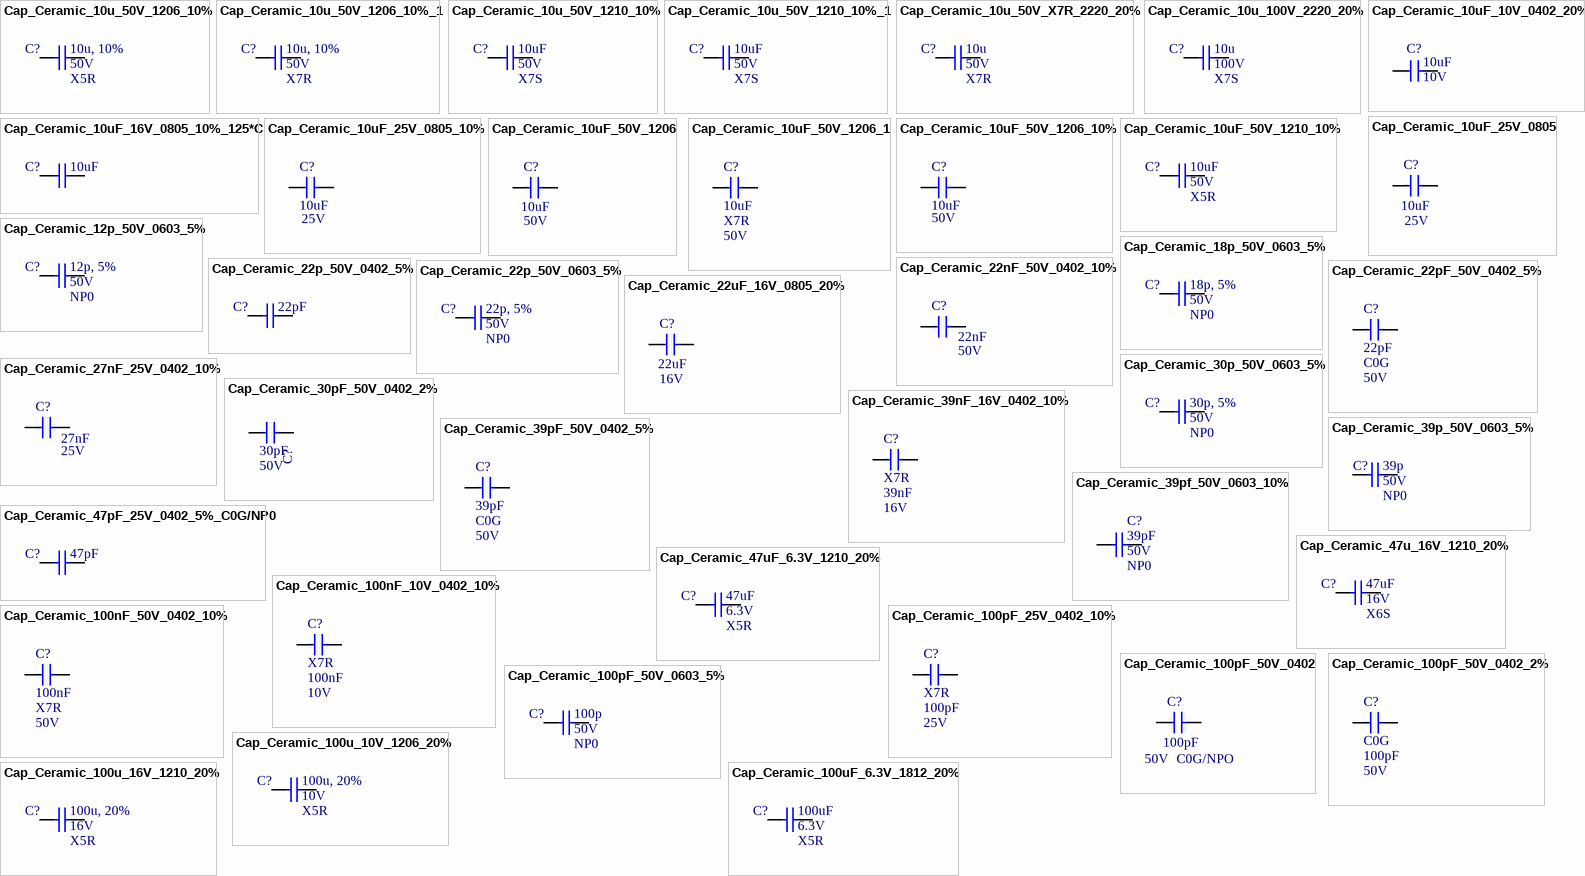
[diagram p2: symbols Cap_Ceramic_10u_50V_1206_10% to Cap_Ceramic_100uF_6.3V_1812_20%]

## Cap_Ceramic_10u_50V_1206_10%
designator C?, comment Voltage: 50V  DIELECTRIC: X5R  (hidden comment: 10u, 10%)
Capacitor, Ceramic, 10u, 50V, 1206, 10%; Manufacturer: TDK Corporation; Manufacturer P/N: C3216X5R1H106K; Outset P/N: 0000020; Value: 10u, 10%
footprint CC_3216_1206_N (Chip Capacitor, 2-Leads, Body 3.2x1.6mm, IPC Medium Density)
pins: 1, 2

## Cap_Ceramic_10u_50V_1206_10%_1
designator C?, comment Voltage: 50V  DIELECTRIC: X7R  (hidden comment: 10u, 10%)
MLCC, 10u, 50V, X7R, 10%, 1206; Manufacturer: TDK Corporation; Manufacturer P/N: CGA5L1X7R1H106K160AC; Outset P/N: PN-0008177; Value: 10u, 10%
footprint CC_3216_1206_N (Chip Capacitor, 2-Leads, Body 3.2x1.6mm, IPC Medium Density)
pins: 1, 2
